# Altium footprint library Molex FFC - FPC Connectors (Through-Hole).PcbLib: 219 footprints (part 14 of 14)
Each footprint in its own frame and in the unit in brackets; x right, y up, seen from the top. Pads: shape width x height; smd on the part's side, far side on the other; paste and mask are expansions set on the pad; w line width, h text height; cw(c..) or ccw(c..) is an arc to the next point about the centre after c.
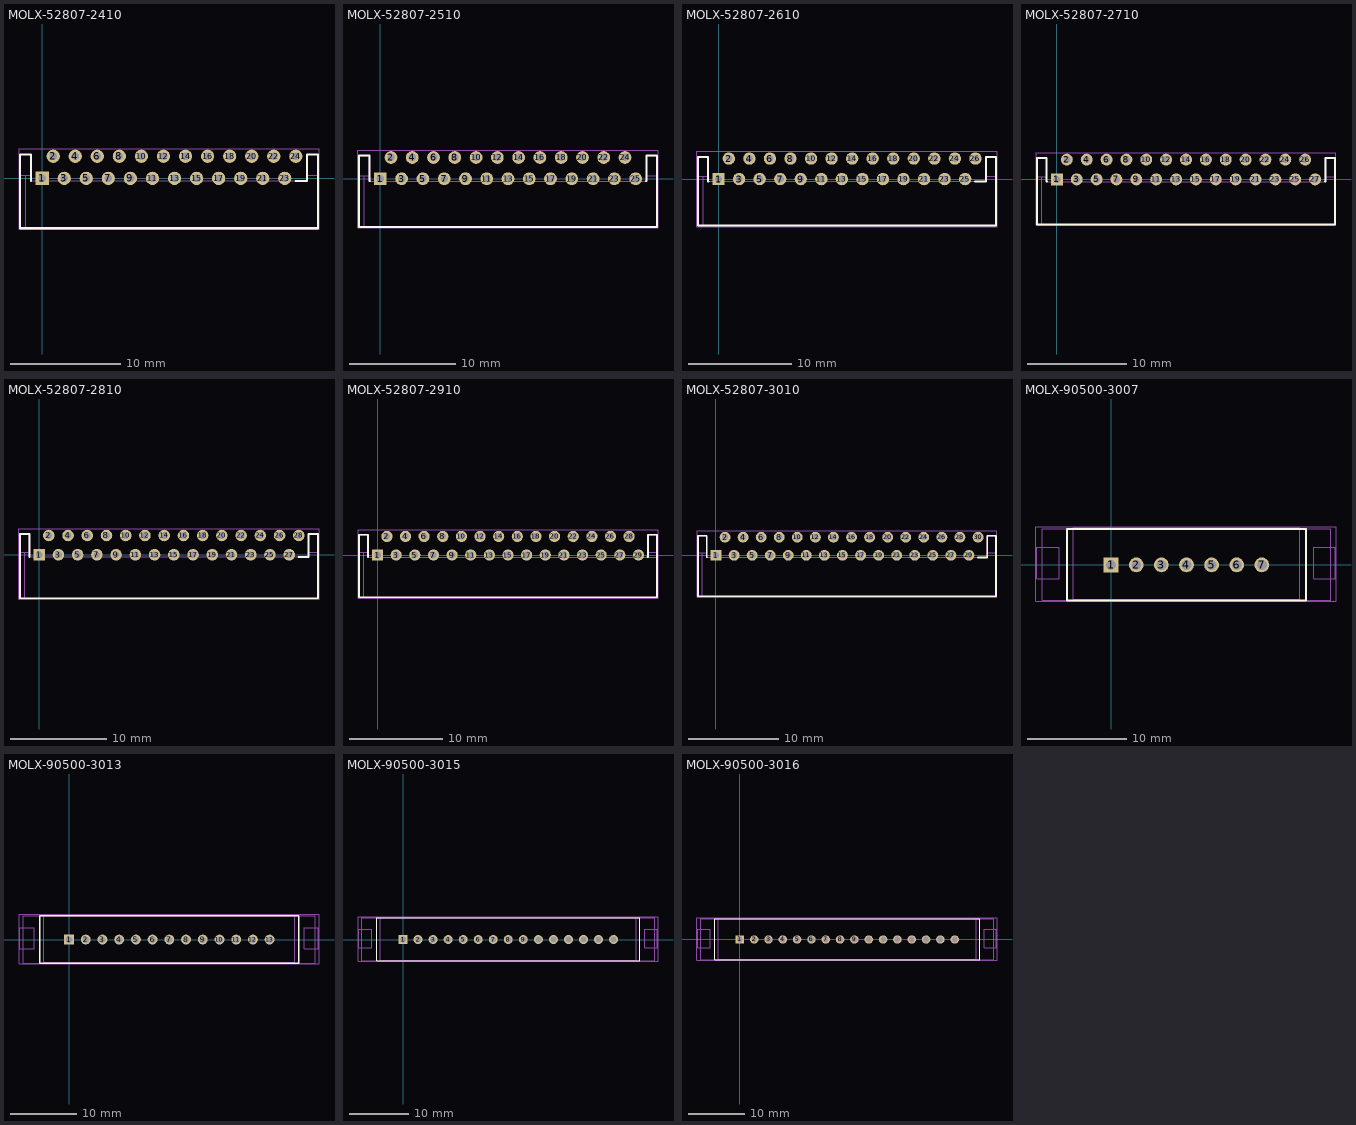
[diagram p13: the footprints below, top view; thin cyan lines are the x and y axes]

## MOLX-52807-2410 [mm] "FFC Connector, 24-Leads, Right Angle, Pitch 1.0 mm, Mated Height 3.6 mm, Through Hole"
height 3.612
pads (24):
  rect 1.2x1.2 hole 0.7: 1(0,0)
  round 1.2 hole 0.7: 2(1,2) 3(2,0) 4(3,2) 5(4,0) 6(5,2) 7(6,0) 8(7,2) 9(8,0) 10(9,2) 11(10,0) 12(11,2) 13(12,0) 14(13,2) 15(14,0) 16(15,2) 17(16,0) 18(17,2) 19(18,0) 20(19,2) 21(20,0) 22(21,2) 23(22,0) 24(23,2)
Top Overlay:
  lines w0.2: -1,-0.225 -1.025,-0.225 -1.025,2.17 -2,2.17 ; 22.973,-0.23 24.025,-0.23 24.025,2.17 25,2.17 25,-4.53 -2,-4.53 -2,2.17 ; -2,2.17 -2,2.17
Mechanical 13:
  lines w0.1: -2,0.27 -1.025,0.27 ; -1.5,-4.53 -1.5,0.27 ; 24.025,0.27 25,0.27 ; -2,-4.53 25,-4.53 25,2.17 24.025,2.17 24.025,-0.23 -1.025,-0.23 -1.025,2.17 -2,2.17 -2,-4.53
Mechanical 15:
  lines w0.05: -2.1,-4.63 25.1,-4.63 25.1,2.7 -2.1,2.7 -2.1,-4.63
3D body "52807-2410.stp": height 3.61, standoff -3.19, extent -2,-4.53 25,2.17

## MOLX-52807-2510 [mm] "FFC Connector, 25-Leads, Right Angle, Pitch 1.0 mm, Mated Height 3.6 mm, Through Hole"
height 3.612
pads (25):
  rect 1.2x1.2 hole 0.7: 1(0,0)
  round 1.2 hole 0.7: 2(1,2) 3(2,0) 4(3,2) 5(4,0) 6(5,2) 7(6,0) 8(7,2) 9(8,0) 10(9,2) 11(10,0) 12(11,2) 13(12,0) 14(13,2) 16(15,2) 18(17,2) 20(19,2) 22(21,2) 24(23,2)
  round 1.2 hole 0.7 mask+0.102: 15(14,0) 17(16,0) 19(18,0) 21(20,0) 23(22,0) 25(24,0)
Top Overlay:
  lines w0.2: -1,-0.23 -1.025,-0.23 -1.025,2.17 -2,2.17 ; 24.973,-0.23 25.025,-0.23 25.025,2.17 26,2.17 26,-4.53 -2,-4.53 -2,2.17 ; -2,2.17 -2,2.17
Mechanical 13:
  lines w0.1: -2,0.27 -1.041,0.27 ; -1.5,-4.53 -1.5,0.27 ; 25.025,0.27 26,0.27 ; -2,-4.53 -2,2.17 -1.025,2.17 -1.025,-0.23 25.025,-0.23 25.025,2.17 26,2.17 26,-4.53 -2,-4.53
Mechanical 15:
  lines w0.05: -2.1,-4.63 -2.1,2.7 26.1,2.7 26.1,-4.63 -2.1,-4.63
3D body "52807-2510.stp": height 3.61, standoff -3.19, extent -2,-4.53 26,2.17

## MOLX-52807-2610 [mm] "FFC Connector, 26-Leads, Right Angle, Pitch 1.0 mm, Mated Height 3.6 mm, Through Hole"
height 3.612
pads (26):
  rect 1.2x1.2 hole 0.7: 1(0,0)
  round 1.2 hole 0.7: 2(1,2) 3(2,0) 4(3,2) 5(4,0) 6(5,2) 7(6,0) 8(7,2) 9(8,0) 10(9,2) 11(10,0) 12(11,2) 13(12,0) 14(13,2) 15(14,0) 16(15,2) 17(16,0) 18(17,2) 19(18,0) 20(19,2) 21(20,0) 22(21,2) 23(22,0) 24(23,2) 25(24,0) 26(25,2)
Top Overlay:
  lines w0.2: -1,-0.225 -1.025,-0.225 -1.025,2.17 -2,2.17 ; 24.973,-0.23 26.025,-0.23 26.025,2.17 27,2.17 27,-4.53 -2,-4.53 -2,2.17 ; -2,2.17 -2,2.17
Mechanical 13:
  lines w0.1: -2,0.27 -1.025,0.27 ; -1.5,-4.53 -1.5,0.27 ; 26.025,0.27 27,0.27 ; -2,-4.53 -2,2.17 -1.025,2.17 -1.025,-0.23 26.025,-0.23 26.025,2.17 27,2.17 27,-4.53 -2,-4.53
Mechanical 15:
  lines w0.05: -2.1,-4.63 -2.1,2.7 27.1,2.7 27.1,-4.63 -2.1,-4.63
3D body "52807-2610.stp": height 3.61, standoff -3.19, extent -2,-4.53 27,2.17

## MOLX-52807-2710 [mm] "FFC Connector, 27-Leads, Right Angle, Pitch 1.0 mm, Mated Height 3.6 mm, Through Hole"
height 3.612
pads (27):
  rect 1.2x1.2 hole 0.7: 1(0,0)
  round 1.2 hole 0.7: 2(1,2) 3(2,0) 4(3,2) 5(4,0) 6(5,2) 7(6,0) 8(7,2) 9(8,0) 10(9,2) 11(10,0) 12(11,2) 13(12,0) 14(13,2) 16(15,2) 18(17,2) 20(19,2) 22(21,2) 24(23,2) 26(25,2)
  round 1.2 hole 0.7 mask+0.102: 15(14,0) 17(16,0) 19(18,0) 21(20,0) 23(22,0) 25(24,0) 27(26,0)
Top Overlay:
  lines w0.2: -1,-0.23 -1.025,-0.23 -1.025,2.17 -2,2.17 ; 26.973,-0.23 27.025,-0.23 27.025,2.17 28,2.17 28,-4.53 -2,-4.53 -2,2.17 ; -2,2.17 -2,2.17
Mechanical 13:
  lines w0.1: -2,0.27 -1.025,0.27 ; -1.5,-4.53 -1.5,0.27 ; 27.025,0.27 28,0.27 ; -2,-4.53 28,-4.53 28,2.17 27.025,2.17 27.025,-0.23 -1.025,-0.23 -1.025,2.17 -2,2.17 -2,-4.53
Mechanical 15:
  lines w0.05: -2.1,-4.63 28.1,-4.63 28.1,2.7 -2.1,2.7 -2.1,-4.63
3D body "52807-2710.stp": height 3.61, standoff -3.19, extent -2,-4.53 28,2.17

## MOLX-52807-2810 [mm] "FFC Connector, 28-Leads, Right Angle, Pitch 1.0 mm, Mated Height 3.6 mm, Through Hole"
height 3.612
pads (28):
  rect 1.2x1.2 hole 0.7: 1(0,0)
  round 1.2 hole 0.7: 2(1,2) 3(2,0) 4(3,2) 5(4,0) 6(5,2) 7(6,0) 8(7,2) 9(8,0) 10(9,2) 11(10,0) 12(11,2) 13(12,0) 14(13,2) 15(14,0) 16(15,2) 17(16,0) 18(17,2) 19(18,0) 20(19,2) 21(20,0) 22(21,2) 23(22,0) 24(23,2) 25(24,0) 26(25,2) 27(26,0) 28(27,2)
Top Overlay:
  lines w0.2: -1,-0.225 -1.025,-0.225 -1.025,2.17 -2,2.17 ; 26.973,-0.23 28.025,-0.23 28.025,2.17 29,2.17 29,-4.53 -2,-4.53 -2,2.17 ; -2,2.17 -2,2.17
Mechanical 13:
  lines w0.1: -2,0.27 -1.025,0.27 ; -1.5,-4.53 -1.5,0.27 ; 28.025,0.27 29,0.27 ; -2,-4.53 29,-4.53 29,2.17 28.025,2.17 28.025,-0.23 -1.025,-0.23 -1.025,2.17 -2,2.17 -2,-4.53
Mechanical 15:
  lines w0.05: -2.1,-4.63 29.1,-4.63 29.1,2.7 -2.1,2.7 -2.1,-4.63
3D body "52807-2810.stp": height 3.61, standoff -3.19, extent -2,-4.53 29,2.17

## MOLX-52807-2910 [mm] "FFC Connector, 29-Leads, Right Angle, Pitch 1.0 mm, Mated Height 3.6 mm, Through Hole"
height 3.612
pads (29):
  rect 1.2x1.2 hole 0.7: 1(0,0)
  round 1.2 hole 0.7: 2(1,2) 3(2,0) 4(3,2) 5(4,0) 6(5,2) 7(6,0) 8(7,2) 9(8,0) 10(9,2) 11(10,0) 12(11,2) 13(12,0) 14(13,2) 15(14,0) 16(15,2) 17(16,0) 18(17,2) 19(18,0) 20(19,2) 21(20,0) 22(21,2) 23(22,0) 24(23,2) 25(24,0) 26(25,2) 27(26,0) 28(27,2) 29(28,0)
Top Overlay:
  lines w0.2: -1,-0.225 -1.025,-0.225 -1.025,2.17 -2,2.17 ; 28.973,-0.23 29.025,-0.23 29.025,2.17 30,2.17 30,-4.53 -2,-4.53 -2,2.17 ; -2,2.17 -2,2.17
Mechanical 13:
  lines w0.1: -2,0.27 -1.025,0.27 ; -1.5,-4.528 -1.5,0.27 ; 29.025,-0.23 29.025,2.17 30,2.17 30,-4.53 -2,-4.53 -2,2.17 -1.025,2.17 -1.025,-0.23 30.025,-0.23 ; 29.025,0.27 30,0.27
Mechanical 15:
  lines w0.05: -2.1,-4.63 -2.1,2.7 30.1,2.7 30.1,-4.63 -2.1,-4.63
3D body "52807-2910.stp": height 3.61, standoff -3.19, extent -2,-4.53 30,2.17

## MOLX-52807-3010 [mm] "FFC Connector, 30-Leads, Right Angle, Pitch 1.0 mm, Mated Height 3.6 mm, Through Hole"
height 3.612
pads (30):
  rect 1.2x1.2 hole 0.7: 1(0,0)
  round 1.2 hole 0.7: 2(1,2) 3(2,0) 4(3,2) 5(4,0) 6(5,2) 7(6,0) 8(7,2) 9(8,0) 10(9,2) 11(10,0) 12(11,2) 13(12,0) 14(13,2) 15(14,0) 16(15,2) 17(16,0) 18(17,2) 19(18,0) 20(19,2) 21(20,0) 22(21,2) 23(22,0) 24(23,2) 25(24,0) 26(25,2) 27(26,0) 28(27,2) 29(28,0) 30(29,2)
Top Overlay:
  lines w0.2: -1,-0.225 -1.025,-0.225 -1.025,2.17 -2,2.17 ; 28.973,-0.23 30.025,-0.23 30.025,2.17 31,2.17 31,-4.53 -2,-4.53 -2,2.17 ; -2,2.17 -2,2.17
Mechanical 13:
  lines w0.1: -2,0.27 -1.025,0.27 ; -1.5,-4.528 -1.5,0.27 ; 30.025,0.27 31,0.27 ; -2,-4.53 31,-4.53 31,2.17 30.025,2.17 30.025,-0.23 -1.025,-0.23 -1.025,2.17 -2,2.17 -2,-4.53
Mechanical 15:
  lines w0.05: -2.1,-4.63 31.1,-4.63 31.1,2.7 -2.1,2.7 -2.1,-4.63
3D body "52807-3010.stp": height 3.61, standoff -3.19, extent -2,-4.53 31,2.17

## MOLX-90500-3007 [mm] "FFC Connector, 7-Leads, Vertical, Pitch 2.54 mm, Mated Height 8.8 mm, Through Hole"
height 11.212
pads (7):
  rect 1.5x1.5 hole 1: 1(0,0)
  round 1.5 hole 1: 2(2.54,0) 3(5.08,0) 4(7.62,0) 5(10.16,0) 6(12.7,0) 7(15.24,0)
Top Overlay:
  lines w0.2: -4.45,-3.6 -4.45,3.65 19.69,3.65 19.69,-3.6 -4.45,-3.6
Mechanical 13:
  lines w0.1: -4.45,-3.6 -6.95,-3.6 -6.95,3.65 -4.45,3.65 ; -4.45,-3.6 -4.45,3.65 ; -4.45,-3.6 19.69,-3.6 ; -4.45,3.65 19.69,3.65 ; 19.69,-3.6 22.19,-3.6 22.19,3.65 19.69,3.65 ; 19.69,-3.6 19.69,3.65 ; -7.5,-1.425 -5.25,-1.425 -5.25,1.775 -7.5,1.775 -7.5,-1.425 ; -3.846,-3.475 -3.846,3.775 19.086,3.775 19.086,-3.475 -3.846,-3.475 ; 20.49,-1.425 20.49,1.775 22.64,1.775 22.64,-1.425 20.49,-1.425
Mechanical 15:
  lines w0.05: -7.6,-3.7 -7.6,3.875 22.74,3.875 22.74,-3.7 -7.6,-3.7
3D body "905003007.stp": height 11.21, standoff -2.99, extent -7.5,-3.6 22.64,3.775

## MOLX-90500-3013 [mm] "FFC Connector, 13-Leads, Vertical, Pitch 2.54 mm, Mated Height 8.8 mm, Through Hole"
height 11.212
pads (13):
  rect 1.5x1.5 hole 1: 1(0,0)
  round 1.5 hole 1: 2(2.54,0) 3(5.08,0) 4(7.62,0) 5(10.16,0) 6(12.7,0) 7(15.24,0) 8(17.78,0) 9(20.32,0) 10(22.86,0) 11(25.4,0) 12(27.94,0) 13(30.48,0)
Top Overlay:
  lines w0.2: -4.45,-3.6 -4.45,3.65 34.93,3.65 34.93,-3.6 -4.45,-3.6
Mechanical 13:
  lines w0.1: -4.45,-3.6 -6.95,-3.6 -6.95,3.65 -4.45,3.65 ; -4.45,-3.6 -4.45,3.65 ; -4.45,-3.6 34.93,-3.6 ; -4.45,3.65 34.93,3.65 ; 34.93,-3.6 37.43,-3.6 37.43,3.65 34.93,3.65 ; 34.93,-3.6 34.93,3.65 ; -7.5,-1.425 -5.25,-1.425 -5.25,1.775 -7.5,1.775 -7.5,-1.425 ; -3.846,-3.475 -3.846,3.775 34.326,3.775 34.326,-3.475 -3.846,-3.475 ; 35.73,-1.425 35.73,1.775 37.88,1.775 37.88,-1.425 35.73,-1.425
Mechanical 15:
  lines w0.05: -7.6,-3.7 -7.6,3.875 37.98,3.875 37.98,-3.7 -7.6,-3.7
3D body "905003013.stp": height 11.21, standoff -2.99, extent -7.5,-3.6 37.88,3.775

## MOLX-90500-3015 [mm] "FFC Connector, 15-Leads, Vertical, Pitch 2.54 mm, Mated Height 8.8 mm, Through Hole"
height 11.212
pads (15):
  rect 1.5x1.5 hole 1: 1(0,0)
  round 1.5 hole 1: 2(2.54,0) 3(5.08,0) 4(7.62,0) 5(10.16,0) 6(12.7,0) 7(15.24,0) 8(17.78,0) 9(20.32,0) 10(22.86,0) 11(25.4,0) 12(27.94,0) 13(30.48,0) 14(33.02,0) 15(35.56,0)
Top Overlay:
  lines w0.2: -4.45,-3.6 -4.45,3.65 40.01,3.65 40.01,-3.6 -4.45,-3.6
Mechanical 13:
  lines w0.1: -4.45,-3.6 -6.95,-3.6 -6.95,3.65 -4.45,3.65 ; -4.45,-3.6 -4.45,3.65 ; -4.45,-3.6 40.01,-3.6 ; -4.45,3.65 40.01,3.65 ; 40.01,-3.6 42.51,-3.6 42.51,3.65 40.01,3.65 ; 40.01,-3.6 40.01,3.65 ; -7.5,-1.425 -5.25,-1.425 -5.25,1.775 -7.5,1.775 -7.5,-1.425 ; -3.846,-3.475 -3.846,3.775 39.406,3.775 39.406,-3.475 -3.846,-3.475 ; 40.81,-1.425 40.81,1.775 42.96,1.775 42.96,-1.425 40.81,-1.425
Mechanical 15:
  lines w0.05: -7.6,-3.7 -7.6,3.875 43.06,3.875 43.06,-3.7 -7.6,-3.7
3D body "905003015.stp": height 11.21, standoff -2.99, extent -7.5,-3.6 42.96,3.775

## MOLX-90500-3016 [mm] "FFC Connector, 16-Leads, Vertical, Pitch 2.54 mm, Mated Height 8.8 mm, Through Hole"
height 11.212
pads (16):
  rect 1.5x1.5 hole 1: 1(0,0)
  round 1.5 hole 1: 2(2.54,0) 3(5.08,0) 4(7.62,0) 5(10.16,0) 6(12.7,0) 7(15.24,0) 8(17.78,0) 9(20.32,0) 10(22.86,0) 11(25.4,0) 12(27.94,0) 13(30.48,0) 14(33.02,0) 15(35.56,0) 16(38.1,0)
Top Overlay:
  lines w0.2: -4.45,-3.6 -4.45,3.65 42.55,3.65 42.55,-3.6 -4.45,-3.6
Mechanical 13:
  lines w0.1: -4.45,-3.6 -6.95,-3.6 -6.95,3.65 -4.45,3.65 ; -4.45,-3.6 -4.45,3.65 ; -4.45,-3.6 42.55,-3.6 ; -4.45,3.65 42.55,3.65 ; 42.55,-3.6 45.05,-3.6 45.05,3.65 42.55,3.65 ; 42.55,-3.6 42.55,3.65 ; -7.5,-1.425 -5.25,-1.425 -5.25,1.775 -7.5,1.775 -7.5,-1.425 ; -3.846,-3.475 -3.846,3.775 41.946,3.775 41.946,-3.475 -3.846,-3.475 ; 43.35,-1.425 43.35,1.775 45.5,1.775 45.5,-1.425 43.35,-1.425
Mechanical 15:
  lines w0.05: -7.6,-3.7 -7.6,3.875 45.6,3.875 45.6,-3.7 -7.6,-3.7
3D body "905003016.stp": height 11.21, standoff -2.99, extent -7.5,-3.6 45.5,3.775